# Altium footprint library PcbLib_ICs.PcbLib: 317 footprints (part 20 of 24)
Each footprint in its own frame and in the unit in brackets; x right, y up, seen from the top. Pads: shape width x height; smd on the part's side, far side on the other; paste and mask are expansions set on the pad; w line width, h text height; cw(c..) or ccw(c..) is an arc to the next point about the centre after c.
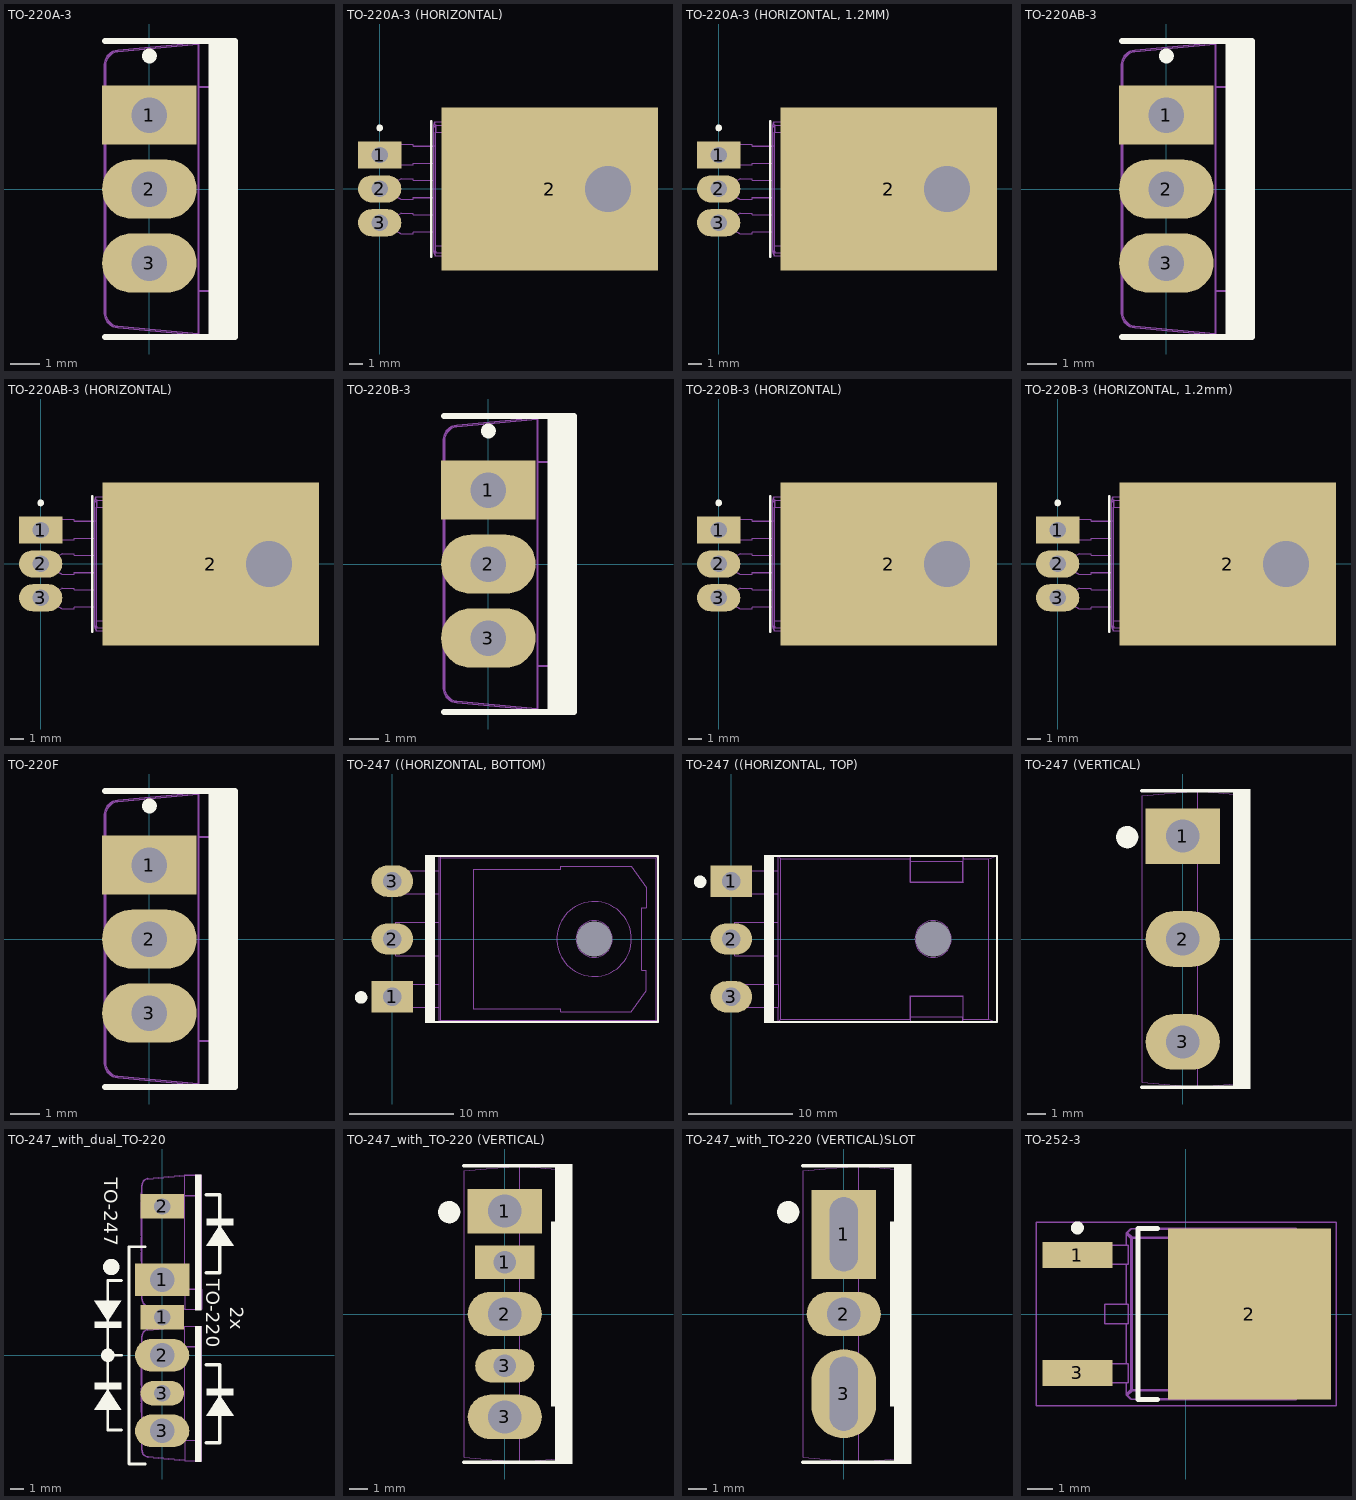
[diagram p19: the footprints below, top view; thin cyan lines are the x and y axes]

## TO-220A-3 [mm]
height 4.57
pads (3):
  rect 3.2x2 hole 1.2: 1(0,2.5)
  oval 3.2x2 hole 1.2: 2(0,0) 3(0,-2.5)
Top Overlay:
  circle w0.25: c0,4.5 r0.125
  rectangle: 2,-5 2.9,5
  lines w0.2: -1.5,-5 2.9,-5 2.9,5 -1.5,5
Top Assy:
  lines w0.05: -1.53,-2.69 -1.53,-2.737 -1.52,-2.737 ; -1.53,-0.067 -1.53,0.003 ; -1.53,0.026 -1.53,0.003 ; -1.53,0.459 -1.53,0.455 -1.52,0.455 ; -1.53,0.468 -1.52,0.468 ; -1.53,0.591 -1.53,0.686 ; -1.53,1.238 -1.53,1.343 ; -1.53,1.689 -1.53,1.783 ; -1.53,2.348 -1.53,2.442 ; -1.53,3.006 -1.53,3.02 -1.52,3.02 ; -1.52,-2.673 -1.53,-2.673 -1.53,-2.473 ; -1.52,-2.473 -1.53,-2.473 ; -1.52,-2.269 -1.53,-2.269 ; -1.52,-2.109 -1.53,-2.109 -1.53,-2.269 ; -1.52,-1.961 -1.53,-1.961 -1.53,-1.94 ; -1.52,-1.94 -1.53,-1.94 ; -1.52,-1.393 -1.53,-1.393 ; -1.52,-1.391 -1.53,-1.391 ; -1.52,-1.281 -1.53,-1.281 ; -1.52,-0.735 -1.53,-0.735 ; -1.52,-0.623 -1.53,-0.623 ; -1.52,-0.076 -1.53,-0.076 -1.53,-0.623 ; -1.52,0.003 -1.53,0.003 ; -1.52,0.035 -1.53,0.035 -1.53,0.363 -1.52,0.363 ; -1.52,0.473 -1.53,0.473 -1.53,0.583 -1.52,0.583 ; -1.52,0.694 -1.53,0.694 -1.53,1.241 -1.52,1.241 ; -1.52,1.352 -1.53,1.352 -1.53,1.68 -1.52,1.68 ; -1.52,1.792 -1.53,1.792 -1.53,1.901 ; -1.52,1.901 -1.53,1.901 ; -1.52,2.339 -1.53,2.339 -1.53,1.901 ; -1.52,2.45 -1.53,2.45 -1.53,2.997 -1.52,2.997 ; -1.52,3.109 -1.53,3.109 -1.53,3.656 -1.52,3.656 ; 1.657,-4.894 -1.064,-4.639 ; 1.657,4.902 -1.064,4.647 ; 1.674,-4.946 -1.067,-4.689 ; 1.674,4.953 -1.067,4.696 ; -1.53,-2.473 -1.53,-2.269 ; -1.53,-1.94 -1.53,-1.393 ; -1.53,-1.393 -1.53,-1.391 ; -1.53,-1.391 -1.53,-1.281 ; -1.53,-1.281 -1.53,-0.735 ; -1.53,-0.735 -1.53,-0.623 ; -1.52,-4.191 ccw(c-1.02,-4.191) -1.067,-4.689 ; -1.52,-4.191 -1.52,4.198 ; -1.52,-4.191 -1.472,-4.191 ; -1.52,4.198 cw(c-1.02,4.198) -1.067,4.696 ; -1.52,4.198 -1.472,4.198 ; -1.472,-4.191 ccw(c-1.022,-4.191) -1.064,-4.639 ; -1.472,-4.191 -1.472,4.198 ; -1.472,4.198 cw(c-1.022,4.198) -1.064,4.647 ; -1.067,-4.689 cw(c-0.688,-4.687) -1.064,-4.639 ; -1.067,4.696 ccw(c-0.688,4.694) -1.064,4.647 ; 1.657,-4.926 ccw(c1.677,-4.926) 1.677,-4.946 ; 1.657,-4.926 ccw(c1.676,-4.924) 1.677,-4.943 ; 1.657,-4.926 1.657,-3.436 ; 1.657,-3.436 ccw(c1.676,-3.434) 1.677,-3.452 ; 1.657,-3.436 1.657,3.443 ; 1.657,-3.436 1.677,-3.436 ; 1.657,3.443 cw(c1.676,3.441) 1.677,3.46 ; 1.657,3.443 1.657,4.934 ; 1.657,3.443 1.677,3.443 ; 1.657,4.934 cw(c1.677,4.934) 1.677,4.954 ; 1.657,4.934 cw(c1.676,4.932) 1.677,4.95 ; 1.677,-4.946 2.907,-4.946 ; 1.677,-4.946 1.677,-4.943 ; 1.677,-4.943 1.677,-3.452 ; 1.677,-4.943 2.907,-4.943 ; 1.677,-3.452 1.677,-3.436 ; 1.677,-3.452 2.907,-3.452 ; 1.677,-3.436 1.677,3.443 ; 1.677,-3.436 2.907,-3.436 ; 1.677,3.443 2.907,3.443 ; 1.677,3.443 1.677,3.46 ; 1.677,3.46 2.907,3.46 ; 1.677,3.46 1.677,4.95 ; 1.677,4.95 2.907,4.95 ; 1.677,4.95 1.677,4.954 ; 1.677,4.954 2.907,4.954 ; 2.907,-4.946 ccw(c2.907,-4.926) 2.927,-4.926 ; 2.907,-4.946 2.927,-4.946 2.927,-4.926 ; 2.907,-4.946 2.907,-4.943 ; 2.907,-4.943 ccw(c2.909,-4.924) 2.927,-4.926 ; 2.907,-4.943 2.907,-3.452 ; 2.907,-3.452 ccw(c2.909,-3.434) 2.927,-3.436 ; 2.907,-3.452 2.907,-3.436 ; 2.907,-3.436 2.907,3.443 ; 2.907,-3.436 2.927,-3.436 ; 2.907,3.443 2.907,3.46 ; 2.907,3.443 2.927,3.443 ; 2.907,3.46 cw(c2.909,3.441) 2.927,3.443 ; 2.907,3.46 2.907,4.95 ; 2.907,4.95 cw(c2.909,4.932) 2.927,4.934 ; 2.907,4.95 2.907,4.954 ; 2.907,4.954 cw(c2.907,4.934) 2.927,4.934 ; 2.907,4.954 2.927,4.954 2.927,4.934 ; 2.927,-4.926 2.927,-3.436 ; 2.927,-3.436 2.927,3.443 ; 2.927,3.443 2.927,4.934
  text ".Designator" at 0.7,-5.162 h3
3D body "User Library-TO220-A PCB.step": height 19.99, standoff -3.5, extent -1.55,-4.95 2.907,4.95

## TO-220A-3 (HORIZONTAL) [mm]
height 4.57
pads (5):
  rect 3.2x2 hole 1.2: 1(0,2.5)
  oval 3.2x2 hole 1.2: 2(0,0) 3(0,-2.5)
  rect 16x12 smd paste-10: 2(12.548,-0.01)
  round 0 hole 3.4 unplated: 6(16.868,-0.006)
Top Overlay:
  circle w0.25: c0,4.5 r0.125
  lines w0.2: 3.8,-5 3.8,5
Top Paste:
  rectangle: 13.948,-3.96 14.948,-2.96
  rectangle: 13.948,-2.81 14.948,-1.81
  rectangle: 13.948,-1.66 14.948,-0.66
  rectangle: 13.948,-0.51 14.948,0.49
  rectangle: 13.948,0.64 14.948,1.64
  rectangle: 13.948,1.79 14.948,2.79
  rectangle: 13.948,2.94 14.948,3.94
  rectangle: 13.948,4.09 14.948,5.09
  rectangle: 12.715,-3.96 13.715,-2.96
  rectangle: 12.715,-2.81 13.715,-1.81
  rectangle: 12.715,-1.66 13.715,-0.66
  rectangle: 12.715,-0.51 13.715,0.49
  rectangle: 12.715,0.64 13.715,1.64
  rectangle: 12.715,1.79 13.715,2.79
  rectangle: 12.715,2.94 13.715,3.94
  rectangle: 12.715,4.09 13.715,5.09
  rectangle: 11.482,-3.96 12.482,-2.96
  rectangle: 11.482,-2.81 12.482,-1.81
  rectangle: 11.482,-1.66 12.482,-0.66
  rectangle: 11.482,-0.51 12.482,0.49
  rectangle: 11.482,0.64 12.482,1.64
  rectangle: 11.482,1.79 12.482,2.79
  rectangle: 11.482,2.94 12.482,3.94
  rectangle: 11.482,4.09 12.482,5.09
  rectangle: 10.248,-3.96 11.248,-2.96
  rectangle: 10.248,-2.81 11.248,-1.81
  rectangle: 10.248,-1.66 11.248,-0.66
  rectangle: 10.248,-0.51 11.248,0.49
  rectangle: 10.248,0.64 11.248,1.64
  rectangle: 10.248,1.79 11.248,2.79
  rectangle: 10.248,2.94 11.248,3.94
  rectangle: 10.248,4.09 11.248,5.09
  rectangle: 9.015,-3.96 10.015,-2.96
  rectangle: 9.015,-2.81 10.015,-1.81
  rectangle: 9.015,-1.66 10.015,-0.66
  rectangle: 9.015,-0.51 10.015,0.49
  rectangle: 9.015,0.64 10.015,1.64
  rectangle: 9.015,1.79 10.015,2.79
  rectangle: 9.015,2.94 10.015,3.94
  rectangle: 9.015,4.09 10.015,5.09
  rectangle: 7.782,-3.96 8.782,-2.96
  rectangle: 7.782,-2.81 8.782,-1.81
  rectangle: 7.782,-1.66 8.782,-0.66
  rectangle: 7.782,-0.51 8.782,0.49
  rectangle: 7.782,0.64 8.782,1.64
  rectangle: 7.782,1.79 8.782,2.79
  rectangle: 7.782,2.94 8.782,3.94
  rectangle: 7.782,4.09 8.782,5.09
  rectangle: 6.548,4.09 7.548,5.09
  rectangle: 6.548,2.94 7.548,3.94
  rectangle: 6.548,1.79 7.548,2.79
  rectangle: 6.548,0.64 7.548,1.64
  rectangle: 6.548,-0.51 7.548,0.49
  rectangle: 6.548,-1.66 7.548,-0.66
  rectangle: 6.548,-2.81 7.548,-1.81
  rectangle: 6.548,-3.96 7.548,-2.96
  rectangle: 13.948,-5.11 14.948,-4.11
  rectangle: 12.715,-5.11 13.715,-4.11
  rectangle: 11.482,-5.11 12.482,-4.11
  rectangle: 10.248,-5.11 11.248,-4.11
  rectangle: 9.015,-5.11 10.015,-4.11
  rectangle: 7.782,-5.11 8.782,-4.11
  rectangle: 6.548,-5.11 7.548,-4.11
Top Assy:
  drawing of 1101 lines, arcs and shapes, not listed
  text ".Designator" at 5.325,-0.77 h3
3D body "User Library-TO220-A-H PCB.step": height 4.55, standoff -3.58, extent -0.3,-4.95 19.913,4.95

## TO-220A-3 (HORIZONTAL, 1.2MM) [mm]
height 4.57
pads (5):
  rect 3.2x2 hole 1.2: 1(0,2.5)
  oval 3.2x2 hole 1.2: 2(0,0) 3(0,-2.5)
  rect 16x12 smd paste-10: 2(12.548,-0.01)
  round 0 hole 3.4 unplated: 6(16.868,-0.006)
Top Overlay:
  circle w0.25: c0,4.5 r0.125
  lines w0.2: 3.8,-5 3.8,5
Top Paste:
  rectangle: 6.548,-5.11 7.548,-4.11
  rectangle: 7.782,-5.11 8.782,-4.11
  rectangle: 9.015,-5.11 10.015,-4.11
  rectangle: 10.248,-5.11 11.248,-4.11
  rectangle: 11.482,-5.11 12.482,-4.11
  rectangle: 12.715,-5.11 13.715,-4.11
  rectangle: 13.948,-5.11 14.948,-4.11
  rectangle: 6.548,-3.96 7.548,-2.96
  rectangle: 6.548,-2.81 7.548,-1.81
  rectangle: 6.548,-1.66 7.548,-0.66
  rectangle: 6.548,-0.51 7.548,0.49
  rectangle: 6.548,0.64 7.548,1.64
  rectangle: 6.548,1.79 7.548,2.79
  rectangle: 6.548,2.94 7.548,3.94
  rectangle: 6.548,4.09 7.548,5.09
  rectangle: 7.782,4.09 8.782,5.09
  rectangle: 7.782,2.94 8.782,3.94
  rectangle: 7.782,1.79 8.782,2.79
  rectangle: 7.782,0.64 8.782,1.64
  rectangle: 7.782,-0.51 8.782,0.49
  rectangle: 7.782,-1.66 8.782,-0.66
  rectangle: 7.782,-2.81 8.782,-1.81
  rectangle: 7.782,-3.96 8.782,-2.96
  rectangle: 9.015,4.09 10.015,5.09
  rectangle: 9.015,2.94 10.015,3.94
  rectangle: 9.015,1.79 10.015,2.79
  rectangle: 9.015,0.64 10.015,1.64
  rectangle: 9.015,-0.51 10.015,0.49
  rectangle: 9.015,-1.66 10.015,-0.66
  rectangle: 9.015,-2.81 10.015,-1.81
  rectangle: 9.015,-3.96 10.015,-2.96
  rectangle: 10.248,4.09 11.248,5.09
  rectangle: 10.248,2.94 11.248,3.94
  rectangle: 10.248,1.79 11.248,2.79
  rectangle: 10.248,0.64 11.248,1.64
  rectangle: 10.248,-0.51 11.248,0.49
  rectangle: 10.248,-1.66 11.248,-0.66
  rectangle: 10.248,-2.81 11.248,-1.81
  rectangle: 10.248,-3.96 11.248,-2.96
  rectangle: 11.482,4.09 12.482,5.09
  rectangle: 11.482,2.94 12.482,3.94
  rectangle: 11.482,1.79 12.482,2.79
  rectangle: 11.482,0.64 12.482,1.64
  rectangle: 11.482,-0.51 12.482,0.49
  rectangle: 11.482,-1.66 12.482,-0.66
  rectangle: 11.482,-2.81 12.482,-1.81
  rectangle: 11.482,-3.96 12.482,-2.96
  rectangle: 12.715,4.09 13.715,5.09
  rectangle: 12.715,2.94 13.715,3.94
  rectangle: 12.715,1.79 13.715,2.79
  rectangle: 12.715,0.64 13.715,1.64
  rectangle: 12.715,-0.51 13.715,0.49
  rectangle: 12.715,-1.66 13.715,-0.66
  rectangle: 12.715,-2.81 13.715,-1.81
  rectangle: 12.715,-3.96 13.715,-2.96
  rectangle: 13.948,4.09 14.948,5.09
  rectangle: 13.948,2.94 14.948,3.94
  rectangle: 13.948,1.79 14.948,2.79
  rectangle: 13.948,0.64 14.948,1.64
  rectangle: 13.948,-0.51 14.948,0.49
  rectangle: 13.948,-1.66 14.948,-0.66
  rectangle: 13.948,-2.81 14.948,-1.81
  rectangle: 13.948,-3.96 14.948,-2.96
Top Assy:
  drawing of 1101 lines, arcs and shapes, not listed
  text ".Designator" at 5.325,-0.77 h3
3D body "User Library-TO220-A-H PCB.step": height 5.85, standoff -2.28, extent -0.3,-4.95 19.913,4.95

## TO-220AB-3 [mm]
height 4.57
pads (3):
  rect 3.2x2 hole 1.2: 1(0,2.5)
  oval 3.2x2 hole 1.2: 2(0,0) 3(0,-2.5)
Top Overlay:
  circle w0.25: c0,4.5 r0.125
  rectangle: 2,-5 2.9,5
  lines w0.2: -1.5,-5 2.9,-5 2.9,5 -1.5,5
Top Assy:
  lines w0.05: -1.53,-2.69 -1.53,-2.737 -1.52,-2.737 ; -1.53,-0.067 -1.53,0.003 ; -1.53,0.026 -1.53,0.003 ; -1.53,0.459 -1.53,0.455 -1.52,0.455 ; -1.53,0.468 -1.52,0.468 ; -1.53,0.591 -1.53,0.686 ; -1.53,1.238 -1.53,1.343 ; -1.53,1.689 -1.53,1.783 ; -1.53,2.348 -1.53,2.442 ; -1.53,3.006 -1.53,3.02 -1.52,3.02 ; -1.52,-2.673 -1.53,-2.673 -1.53,-2.473 ; -1.52,-2.473 -1.53,-2.473 ; -1.52,-2.269 -1.53,-2.269 ; -1.52,-2.109 -1.53,-2.109 -1.53,-2.269 ; -1.52,-1.961 -1.53,-1.961 -1.53,-1.94 ; -1.52,-1.94 -1.53,-1.94 ; -1.52,-1.393 -1.53,-1.393 ; -1.52,-1.391 -1.53,-1.391 ; -1.52,-1.281 -1.53,-1.281 ; -1.52,-0.735 -1.53,-0.735 ; -1.52,-0.623 -1.53,-0.623 ; -1.52,-0.076 -1.53,-0.076 -1.53,-0.623 ; -1.52,0.003 -1.53,0.003 ; -1.52,0.035 -1.53,0.035 -1.53,0.363 -1.52,0.363 ; -1.52,0.473 -1.53,0.473 -1.53,0.583 -1.52,0.583 ; -1.52,0.694 -1.53,0.694 -1.53,1.241 -1.52,1.241 ; -1.52,1.352 -1.53,1.352 -1.53,1.68 -1.52,1.68 ; -1.52,1.792 -1.53,1.792 -1.53,1.901 ; -1.52,1.901 -1.53,1.901 ; -1.52,2.339 -1.53,2.339 -1.53,1.901 ; -1.52,2.45 -1.53,2.45 -1.53,2.997 -1.52,2.997 ; -1.52,3.109 -1.53,3.109 -1.53,3.656 -1.52,3.656 ; 1.657,-4.894 -1.064,-4.639 ; 1.657,4.902 -1.064,4.647 ; 1.674,-4.946 -1.067,-4.689 ; 1.674,4.953 -1.067,4.696 ; -1.53,-2.473 -1.53,-2.269 ; -1.53,-1.94 -1.53,-1.393 ; -1.53,-1.393 -1.53,-1.391 ; -1.53,-1.391 -1.53,-1.281 ; -1.53,-1.281 -1.53,-0.735 ; -1.53,-0.735 -1.53,-0.623 ; -1.52,-4.191 ccw(c-1.02,-4.191) -1.067,-4.689 ; -1.52,-4.191 -1.52,4.198 ; -1.52,-4.191 -1.472,-4.191 ; -1.52,4.198 cw(c-1.02,4.198) -1.067,4.696 ; -1.52,4.198 -1.472,4.198 ; -1.472,-4.191 ccw(c-1.022,-4.191) -1.064,-4.639 ; -1.472,-4.191 -1.472,4.198 ; -1.472,4.198 cw(c-1.022,4.198) -1.064,4.647 ; -1.067,-4.689 cw(c-0.688,-4.687) -1.064,-4.639 ; -1.067,4.696 ccw(c-0.688,4.694) -1.064,4.647 ; 1.657,-4.926 ccw(c1.677,-4.926) 1.677,-4.946 ; 1.657,-4.926 ccw(c1.676,-4.924) 1.677,-4.943 ; 1.657,-4.926 1.657,-3.436 ; 1.657,-3.436 ccw(c1.676,-3.434) 1.677,-3.452 ; 1.657,-3.436 1.657,3.443 ; 1.657,-3.436 1.677,-3.436 ; 1.657,3.443 cw(c1.676,3.441) 1.677,3.46 ; 1.657,3.443 1.657,4.934 ; 1.657,3.443 1.677,3.443 ; 1.657,4.934 cw(c1.677,4.934) 1.677,4.954 ; 1.657,4.934 cw(c1.676,4.932) 1.677,4.95 ; 1.677,-4.946 2.907,-4.946 ; 1.677,-4.946 1.677,-4.943 ; 1.677,-4.943 1.677,-3.452 ; 1.677,-4.943 2.907,-4.943 ; 1.677,-3.452 1.677,-3.436 ; 1.677,-3.452 2.907,-3.452 ; 1.677,-3.436 1.677,3.443 ; 1.677,-3.436 2.907,-3.436 ; 1.677,3.443 2.907,3.443 ; 1.677,3.443 1.677,3.46 ; 1.677,3.46 2.907,3.46 ; 1.677,3.46 1.677,4.95 ; 1.677,4.95 2.907,4.95 ; 1.677,4.95 1.677,4.954 ; 1.677,4.954 2.907,4.954 ; 2.907,-4.946 ccw(c2.907,-4.926) 2.927,-4.926 ; 2.907,-4.946 2.927,-4.946 2.927,-4.926 ; 2.907,-4.946 2.907,-4.943 ; 2.907,-4.943 ccw(c2.909,-4.924) 2.927,-4.926 ; 2.907,-4.943 2.907,-3.452 ; 2.907,-3.452 ccw(c2.909,-3.434) 2.927,-3.436 ; 2.907,-3.452 2.907,-3.436 ; 2.907,-3.436 2.907,3.443 ; 2.907,-3.436 2.927,-3.436 ; 2.907,3.443 2.907,3.46 ; 2.907,3.443 2.927,3.443 ; 2.907,3.46 cw(c2.909,3.441) 2.927,3.443 ; 2.907,3.46 2.907,4.95 ; 2.907,4.95 cw(c2.909,4.932) 2.927,4.934 ; 2.907,4.95 2.907,4.954 ; 2.907,4.954 cw(c2.907,4.934) 2.927,4.934 ; 2.907,4.954 2.927,4.954 2.927,4.934 ; 2.927,-4.926 2.927,-3.436 ; 2.927,-3.436 2.927,3.443 ; 2.927,3.443 2.927,4.934
  text ".Designator" at 0.7,-5.162 h3
3D body "User Library-TO220-AB PCB.step": height 20.05, standoff -3.5, extent -1.55,-4.95 2.907,4.95

## TO-220AB-3 (HORIZONTAL) [mm]
height 4.57
pads (5):
  rect 3.2x2 hole 1.2: 1(0,2.5)
  oval 3.2x2 hole 1.2: 2(0,0) 3(0,-2.5)
  rect 16x12 smd paste-10: 2(12.548,-0.01)
  round 0 hole 3.4 unplated: 6(16.868,-0.006)
Top Overlay:
  circle w0.25: c0,4.5 r0.125
  lines w0.2: 3.8,-5 3.8,5
Top Paste:
  rectangle: 13.948,-3.96 14.948,-2.96
  rectangle: 13.948,-2.81 14.948,-1.81
  rectangle: 13.948,-1.66 14.948,-0.66
  rectangle: 13.948,-0.51 14.948,0.49
  rectangle: 13.948,0.64 14.948,1.64
  rectangle: 13.948,1.79 14.948,2.79
  rectangle: 13.948,2.94 14.948,3.94
  rectangle: 13.948,4.09 14.948,5.09
  rectangle: 12.715,-3.96 13.715,-2.96
  rectangle: 12.715,-2.81 13.715,-1.81
  rectangle: 12.715,-1.66 13.715,-0.66
  rectangle: 12.715,-0.51 13.715,0.49
  rectangle: 12.715,0.64 13.715,1.64
  rectangle: 12.715,1.79 13.715,2.79
  rectangle: 12.715,2.94 13.715,3.94
  rectangle: 12.715,4.09 13.715,5.09
  rectangle: 11.482,-3.96 12.482,-2.96
  rectangle: 11.482,-2.81 12.482,-1.81
  rectangle: 11.482,-1.66 12.482,-0.66
  rectangle: 11.482,-0.51 12.482,0.49
  rectangle: 11.482,0.64 12.482,1.64
  rectangle: 11.482,1.79 12.482,2.79
  rectangle: 11.482,2.94 12.482,3.94
  rectangle: 11.482,4.09 12.482,5.09
  rectangle: 10.248,-3.96 11.248,-2.96
  rectangle: 10.248,-2.81 11.248,-1.81
  rectangle: 10.248,-1.66 11.248,-0.66
  rectangle: 10.248,-0.51 11.248,0.49
  rectangle: 10.248,0.64 11.248,1.64
  rectangle: 10.248,1.79 11.248,2.79
  rectangle: 10.248,2.94 11.248,3.94
  rectangle: 10.248,4.09 11.248,5.09
  rectangle: 9.015,-3.96 10.015,-2.96
  rectangle: 9.015,-2.81 10.015,-1.81
  rectangle: 9.015,-1.66 10.015,-0.66
  rectangle: 9.015,-0.51 10.015,0.49
  rectangle: 9.015,0.64 10.015,1.64
  rectangle: 9.015,1.79 10.015,2.79
  rectangle: 9.015,2.94 10.015,3.94
  rectangle: 9.015,4.09 10.015,5.09
  rectangle: 7.782,-3.96 8.782,-2.96
  rectangle: 7.782,-2.81 8.782,-1.81
  rectangle: 7.782,-1.66 8.782,-0.66
  rectangle: 7.782,-0.51 8.782,0.49
  rectangle: 7.782,0.64 8.782,1.64
  rectangle: 7.782,1.79 8.782,2.79
  rectangle: 7.782,2.94 8.782,3.94
  rectangle: 7.782,4.09 8.782,5.09
  rectangle: 6.548,4.09 7.548,5.09
  rectangle: 6.548,2.94 7.548,3.94
  rectangle: 6.548,1.79 7.548,2.79
  rectangle: 6.548,0.64 7.548,1.64
  rectangle: 6.548,-0.51 7.548,0.49
  rectangle: 6.548,-1.66 7.548,-0.66
  rectangle: 6.548,-2.81 7.548,-1.81
  rectangle: 6.548,-3.96 7.548,-2.96
  rectangle: 13.948,-5.11 14.948,-4.11
  rectangle: 12.715,-5.11 13.715,-4.11
  rectangle: 11.482,-5.11 12.482,-4.11
  rectangle: 10.248,-5.11 11.248,-4.11
  rectangle: 9.015,-5.11 10.015,-4.11
  rectangle: 7.782,-5.11 8.782,-4.11
  rectangle: 6.548,-5.11 7.548,-4.11
Top Assy:
  drawing of 1105 lines, arcs and shapes, not listed
  text ".Designator" at 5.325,-0.77 h3
3D body "User Library-TO220-AB-H PCB.step": height 4.55, standoff -3.58, extent -0.3,-4.95 19.912,4.95

## TO-220B-3 [mm]
height 4.57
pads (3):
  rect 3.2x2 hole 1.2: 1(0,2.5)
  oval 3.2x2 hole 1.2: 2(0,0) 3(0,-2.5)
Top Overlay:
  circle w0.25: c0,4.5 r0.125
  rectangle: 2,-5 2.9,5
  lines w0.2: -1.5,-5 2.9,-5 2.9,5 -1.5,5
Top Assy:
  lines w0.05: -1.53,-2.69 -1.53,-2.737 -1.52,-2.737 ; -1.53,-0.067 -1.53,0.003 ; -1.53,0.026 -1.53,0.003 ; -1.53,0.459 -1.53,0.455 -1.52,0.455 ; -1.53,0.468 -1.52,0.468 ; -1.53,0.591 -1.53,0.686 ; -1.53,1.238 -1.53,1.343 ; -1.53,1.689 -1.53,1.783 ; -1.53,2.348 -1.53,2.442 ; -1.53,3.006 -1.53,3.02 -1.52,3.02 ; -1.52,-2.673 -1.53,-2.673 -1.53,-2.473 ; -1.52,-2.473 -1.53,-2.473 ; -1.52,-2.269 -1.53,-2.269 ; -1.52,-2.109 -1.53,-2.109 -1.53,-2.269 ; -1.52,-1.961 -1.53,-1.961 -1.53,-1.94 ; -1.52,-1.94 -1.53,-1.94 ; -1.52,-1.393 -1.53,-1.393 ; -1.52,-1.391 -1.53,-1.391 ; -1.52,-1.281 -1.53,-1.281 ; -1.52,-0.735 -1.53,-0.735 ; -1.52,-0.623 -1.53,-0.623 ; -1.52,-0.076 -1.53,-0.076 -1.53,-0.623 ; -1.52,0.003 -1.53,0.003 ; -1.52,0.035 -1.53,0.035 -1.53,0.363 -1.52,0.363 ; -1.52,0.473 -1.53,0.473 -1.53,0.583 -1.52,0.583 ; -1.52,0.694 -1.53,0.694 -1.53,1.241 -1.52,1.241 ; -1.52,1.352 -1.53,1.352 -1.53,1.68 -1.52,1.68 ; -1.52,1.792 -1.53,1.792 -1.53,1.901 ; -1.52,1.901 -1.53,1.901 ; -1.52,2.339 -1.53,2.339 -1.53,1.901 ; -1.52,2.45 -1.53,2.45 -1.53,2.997 -1.52,2.997 ; -1.52,3.109 -1.53,3.109 -1.53,3.656 -1.52,3.656 ; 1.657,-4.894 -1.064,-4.639 ; 1.657,4.902 -1.064,4.647 ; 1.674,-4.946 -1.067,-4.689 ; 1.674,4.953 -1.067,4.696 ; -1.53,-2.473 -1.53,-2.269 ; -1.53,-1.94 -1.53,-1.393 ; -1.53,-1.393 -1.53,-1.391 ; -1.53,-1.391 -1.53,-1.281 ; -1.53,-1.281 -1.53,-0.735 ; -1.53,-0.735 -1.53,-0.623 ; -1.52,-4.191 ccw(c-1.02,-4.191) -1.067,-4.689 ; -1.52,-4.191 -1.52,4.198 ; -1.52,-4.191 -1.472,-4.191 ; -1.52,4.198 cw(c-1.02,4.198) -1.067,4.696 ; -1.52,4.198 -1.472,4.198 ; -1.472,-4.191 ccw(c-1.022,-4.191) -1.064,-4.639 ; -1.472,-4.191 -1.472,4.198 ; -1.472,4.198 cw(c-1.022,4.198) -1.064,4.647 ; -1.067,-4.689 cw(c-0.688,-4.687) -1.064,-4.639 ; -1.067,4.696 ccw(c-0.688,4.694) -1.064,4.647 ; 1.657,-4.926 ccw(c1.677,-4.926) 1.677,-4.946 ; 1.657,-4.926 ccw(c1.676,-4.924) 1.677,-4.943 ; 1.657,-4.926 1.657,-3.436 ; 1.657,-3.436 ccw(c1.676,-3.434) 1.677,-3.452 ; 1.657,-3.436 1.657,3.443 ; 1.657,-3.436 1.677,-3.436 ; 1.657,3.443 cw(c1.676,3.441) 1.677,3.46 ; 1.657,3.443 1.657,4.934 ; 1.657,3.443 1.677,3.443 ; 1.657,4.934 cw(c1.677,4.934) 1.677,4.954 ; 1.657,4.934 cw(c1.676,4.932) 1.677,4.95 ; 1.677,-4.946 2.907,-4.946 ; 1.677,-4.946 1.677,-4.943 ; 1.677,-4.943 1.677,-3.452 ; 1.677,-4.943 2.907,-4.943 ; 1.677,-3.452 1.677,-3.436 ; 1.677,-3.452 2.907,-3.452 ; 1.677,-3.436 1.677,3.443 ; 1.677,-3.436 2.907,-3.436 ; 1.677,3.443 2.907,3.443 ; 1.677,3.443 1.677,3.46 ; 1.677,3.46 2.907,3.46 ; 1.677,3.46 1.677,4.95 ; 1.677,4.95 2.907,4.95 ; 1.677,4.95 1.677,4.954 ; 1.677,4.954 2.907,4.954 ; 2.907,-4.946 ccw(c2.907,-4.926) 2.927,-4.926 ; 2.907,-4.946 2.927,-4.946 2.927,-4.926 ; 2.907,-4.946 2.907,-4.943 ; 2.907,-4.943 ccw(c2.909,-4.924) 2.927,-4.926 ; 2.907,-4.943 2.907,-3.452 ; 2.907,-3.452 ccw(c2.909,-3.434) 2.927,-3.436 ; 2.907,-3.452 2.907,-3.436 ; 2.907,-3.436 2.907,3.443 ; 2.907,-3.436 2.927,-3.436 ; 2.907,3.443 2.907,3.46 ; 2.907,3.443 2.927,3.443 ; 2.907,3.46 cw(c2.909,3.441) 2.927,3.443 ; 2.907,3.46 2.907,4.95 ; 2.907,4.95 cw(c2.909,4.932) 2.927,4.934 ; 2.907,4.95 2.907,4.954 ; 2.907,4.954 cw(c2.907,4.934) 2.927,4.934 ; 2.907,4.954 2.927,4.954 2.927,4.934 ; 2.927,-4.926 2.927,-3.436 ; 2.927,-3.436 2.927,3.443 ; 2.927,3.443 2.927,4.934
  text ".Designator" at 0.7,-5.162 h3
3D body "User Library-TO220-B PCB.step": height 20.05, standoff -3.5, extent -1.55,-4.95 2.907,4.95

## TO-220B-3 (HORIZONTAL) [mm]
height 4.57
pads (5):
  rect 3.2x2 hole 1.2: 1(0,2.5)
  oval 3.2x2 hole 1.2: 2(0,0) 3(0,-2.5)
  rect 16x12 smd paste-10: 2(12.548,-0.01)
  round 0 hole 3.4 unplated: 6(16.868,-0.006)
Top Overlay:
  circle w0.25: c0,4.5 r0.125
  lines w0.2: 3.8,-5 3.8,5
Top Paste:
  rectangle: 6.548,-5.11 7.548,-4.11
  rectangle: 7.782,-5.11 8.782,-4.11
  rectangle: 9.015,-5.11 10.015,-4.11
  rectangle: 10.248,-5.11 11.248,-4.11
  rectangle: 11.482,-5.11 12.482,-4.11
  rectangle: 12.715,-5.11 13.715,-4.11
  rectangle: 13.948,-5.11 14.948,-4.11
  rectangle: 6.548,-3.96 7.548,-2.96
  rectangle: 6.548,-2.81 7.548,-1.81
  rectangle: 6.548,-1.66 7.548,-0.66
  rectangle: 6.548,-0.51 7.548,0.49
  rectangle: 6.548,0.64 7.548,1.64
  rectangle: 6.548,1.79 7.548,2.79
  rectangle: 6.548,2.94 7.548,3.94
  rectangle: 6.548,4.09 7.548,5.09
  rectangle: 7.782,4.09 8.782,5.09
  rectangle: 7.782,2.94 8.782,3.94
  rectangle: 7.782,1.79 8.782,2.79
  rectangle: 7.782,0.64 8.782,1.64
  rectangle: 7.782,-0.51 8.782,0.49
  rectangle: 7.782,-1.66 8.782,-0.66
  rectangle: 7.782,-2.81 8.782,-1.81
  rectangle: 7.782,-3.96 8.782,-2.96
  rectangle: 9.015,4.09 10.015,5.09
  rectangle: 9.015,2.94 10.015,3.94
  rectangle: 9.015,1.79 10.015,2.79
  rectangle: 9.015,0.64 10.015,1.64
  rectangle: 9.015,-0.51 10.015,0.49
  rectangle: 9.015,-1.66 10.015,-0.66
  rectangle: 9.015,-2.81 10.015,-1.81
  rectangle: 9.015,-3.96 10.015,-2.96
  rectangle: 10.248,4.09 11.248,5.09
  rectangle: 10.248,2.94 11.248,3.94
  rectangle: 10.248,1.79 11.248,2.79
  rectangle: 10.248,0.64 11.248,1.64
  rectangle: 10.248,-0.51 11.248,0.49
  rectangle: 10.248,-1.66 11.248,-0.66
  rectangle: 10.248,-2.81 11.248,-1.81
  rectangle: 10.248,-3.96 11.248,-2.96
  rectangle: 11.482,4.09 12.482,5.09
  rectangle: 11.482,2.94 12.482,3.94
  rectangle: 11.482,1.79 12.482,2.79
  rectangle: 11.482,0.64 12.482,1.64
  rectangle: 11.482,-0.51 12.482,0.49
  rectangle: 11.482,-1.66 12.482,-0.66
  rectangle: 11.482,-2.81 12.482,-1.81
  rectangle: 11.482,-3.96 12.482,-2.96
  rectangle: 12.715,4.09 13.715,5.09
  rectangle: 12.715,2.94 13.715,3.94
  rectangle: 12.715,1.79 13.715,2.79
  rectangle: 12.715,0.64 13.715,1.64
  rectangle: 12.715,-0.51 13.715,0.49
  rectangle: 12.715,-1.66 13.715,-0.66
  rectangle: 12.715,-2.81 13.715,-1.81
  rectangle: 12.715,-3.96 13.715,-2.96
  rectangle: 13.948,4.09 14.948,5.09
  rectangle: 13.948,2.94 14.948,3.94
  rectangle: 13.948,1.79 14.948,2.79
  rectangle: 13.948,0.64 14.948,1.64
  rectangle: 13.948,-0.51 14.948,0.49
  rectangle: 13.948,-1.66 14.948,-0.66
  rectangle: 13.948,-2.81 14.948,-1.81
  rectangle: 13.948,-3.96 14.948,-2.96
Top Assy:
  drawing of 1096 lines, arcs and shapes, not listed
  text ".Designator" at 5.325,-0.77 h3
3D body "User Library-TO220-B-H PCB.step": height 4.55, standoff -3.58, extent -0.3,-4.95 19.912,4.95

## TO-220B-3 (HORIZONTAL, 1.2mm) [mm]
height 4.57
pads (5):
  rect 3.2x2 hole 1.2: 1(0,2.5)
  oval 3.2x2 hole 1.2: 2(0,0) 3(0,-2.5)
  rect 16x12 smd paste-10: 2(12.548,-0.01)
  round 0 hole 3.4 unplated: 6(16.868,-0.006)
Top Overlay:
  circle w0.25: c0,4.5 r0.125
  lines w0.2: 3.8,-5 3.8,5
Top Paste:
  rectangle: 6.548,-5.11 7.548,-4.11
  rectangle: 7.782,-5.11 8.782,-4.11
  rectangle: 9.015,-5.11 10.015,-4.11
  rectangle: 10.248,-5.11 11.248,-4.11
  rectangle: 11.482,-5.11 12.482,-4.11
  rectangle: 12.715,-5.11 13.715,-4.11
  rectangle: 13.948,-5.11 14.948,-4.11
  rectangle: 6.548,-3.96 7.548,-2.96
  rectangle: 6.548,-2.81 7.548,-1.81
  rectangle: 6.548,-1.66 7.548,-0.66
  rectangle: 6.548,-0.51 7.548,0.49
  rectangle: 6.548,0.64 7.548,1.64
  rectangle: 6.548,1.79 7.548,2.79
  rectangle: 6.548,2.94 7.548,3.94
  rectangle: 6.548,4.09 7.548,5.09
  rectangle: 7.782,4.09 8.782,5.09
  rectangle: 7.782,2.94 8.782,3.94
  rectangle: 7.782,1.79 8.782,2.79
  rectangle: 7.782,0.64 8.782,1.64
  rectangle: 7.782,-0.51 8.782,0.49
  rectangle: 7.782,-1.66 8.782,-0.66
  rectangle: 7.782,-2.81 8.782,-1.81
  rectangle: 7.782,-3.96 8.782,-2.96
  rectangle: 9.015,4.09 10.015,5.09
  rectangle: 9.015,2.94 10.015,3.94
  rectangle: 9.015,1.79 10.015,2.79
  rectangle: 9.015,0.64 10.015,1.64
  rectangle: 9.015,-0.51 10.015,0.49
  rectangle: 9.015,-1.66 10.015,-0.66
  rectangle: 9.015,-2.81 10.015,-1.81
  rectangle: 9.015,-3.96 10.015,-2.96
  rectangle: 10.248,4.09 11.248,5.09
  rectangle: 10.248,2.94 11.248,3.94
  rectangle: 10.248,1.79 11.248,2.79
  rectangle: 10.248,0.64 11.248,1.64
  rectangle: 10.248,-0.51 11.248,0.49
  rectangle: 10.248,-1.66 11.248,-0.66
  rectangle: 10.248,-2.81 11.248,-1.81
  rectangle: 10.248,-3.96 11.248,-2.96
  rectangle: 11.482,4.09 12.482,5.09
  rectangle: 11.482,2.94 12.482,3.94
  rectangle: 11.482,1.79 12.482,2.79
  rectangle: 11.482,0.64 12.482,1.64
  rectangle: 11.482,-0.51 12.482,0.49
  rectangle: 11.482,-1.66 12.482,-0.66
  rectangle: 11.482,-2.81 12.482,-1.81
  rectangle: 11.482,-3.96 12.482,-2.96
  rectangle: 12.715,4.09 13.715,5.09
  rectangle: 12.715,2.94 13.715,3.94
  rectangle: 12.715,1.79 13.715,2.79
  rectangle: 12.715,0.64 13.715,1.64
  rectangle: 12.715,-0.51 13.715,0.49
  rectangle: 12.715,-1.66 13.715,-0.66
  rectangle: 12.715,-2.81 13.715,-1.81
  rectangle: 12.715,-3.96 13.715,-2.96
  rectangle: 13.948,4.09 14.948,5.09
  rectangle: 13.948,2.94 14.948,3.94
  rectangle: 13.948,1.79 14.948,2.79
  rectangle: 13.948,0.64 14.948,1.64
  rectangle: 13.948,-0.51 14.948,0.49
  rectangle: 13.948,-1.66 14.948,-0.66
  rectangle: 13.948,-2.81 14.948,-1.81
  rectangle: 13.948,-3.96 14.948,-2.96
Top Assy:
  drawing of 1096 lines, arcs and shapes, not listed
  text ".Designator" at 5.325,-0.77 h3
3D body "User Library-TO220-B-H PCB.step": height 5.85, standoff -2.28, extent -0.3,-4.95 19.913,4.95

## TO-220F [mm]
height 4.57
pads (3):
  rect 3.2x2 hole 1.2: 1(0,2.5)
  oval 3.2x2 hole 1.2: 2(0,0) 3(0,-2.5)
Top Overlay:
  circle w0.25: c0,4.5 r0.125
  rectangle: 2,-5 2.9,5
  lines w0.2: -1.5,-5 2.9,-5 2.9,5 -1.5,5
Top Assy:
  lines w0.05: -1.53,-2.69 -1.53,-2.737 -1.52,-2.737 ; -1.53,-0.067 -1.53,0.003 ; -1.53,0.026 -1.53,0.003 ; -1.53,0.459 -1.53,0.455 -1.52,0.455 ; -1.53,0.468 -1.52,0.468 ; -1.53,0.591 -1.53,0.686 ; -1.53,1.238 -1.53,1.343 ; -1.53,1.689 -1.53,1.783 ; -1.53,2.348 -1.53,2.442 ; -1.53,3.006 -1.53,3.02 -1.52,3.02 ; -1.52,-2.673 -1.53,-2.673 -1.53,-2.473 ; -1.52,-2.473 -1.53,-2.473 ; -1.52,-2.269 -1.53,-2.269 ; -1.52,-2.109 -1.53,-2.109 -1.53,-2.269 ; -1.52,-1.961 -1.53,-1.961 -1.53,-1.94 ; -1.52,-1.94 -1.53,-1.94 ; -1.52,-1.393 -1.53,-1.393 ; -1.52,-1.391 -1.53,-1.391 ; -1.52,-1.281 -1.53,-1.281 ; -1.52,-0.735 -1.53,-0.735 ; -1.52,-0.623 -1.53,-0.623 ; -1.52,-0.076 -1.53,-0.076 -1.53,-0.623 ; -1.52,0.003 -1.53,0.003 ; -1.52,0.035 -1.53,0.035 -1.53,0.363 -1.52,0.363 ; -1.52,0.473 -1.53,0.473 -1.53,0.583 -1.52,0.583 ; -1.52,0.694 -1.53,0.694 -1.53,1.241 -1.52,1.241 ; -1.52,1.352 -1.53,1.352 -1.53,1.68 -1.52,1.68 ; -1.52,1.792 -1.53,1.792 -1.53,1.901 ; -1.52,1.901 -1.53,1.901 ; -1.52,2.339 -1.53,2.339 -1.53,1.901 ; -1.52,2.45 -1.53,2.45 -1.53,2.997 -1.52,2.997 ; -1.52,3.109 -1.53,3.109 -1.53,3.656 -1.52,3.656 ; 1.657,-4.894 -1.064,-4.639 ; 1.657,4.902 -1.064,4.647 ; 1.674,-4.946 -1.067,-4.689 ; 1.674,4.953 -1.067,4.696 ; -1.53,-2.473 -1.53,-2.269 ; -1.53,-1.94 -1.53,-1.393 ; -1.53,-1.393 -1.53,-1.391 ; -1.53,-1.391 -1.53,-1.281 ; -1.53,-1.281 -1.53,-0.735 ; -1.53,-0.735 -1.53,-0.623 ; -1.52,-4.191 ccw(c-1.02,-4.191) -1.067,-4.689 ; -1.52,-4.191 -1.52,4.198 ; -1.52,-4.191 -1.472,-4.191 ; -1.52,4.198 cw(c-1.02,4.198) -1.067,4.696 ; -1.52,4.198 -1.472,4.198 ; -1.472,-4.191 ccw(c-1.022,-4.191) -1.064,-4.639 ; -1.472,-4.191 -1.472,4.198 ; -1.472,4.198 cw(c-1.022,4.198) -1.064,4.647 ; -1.067,-4.689 cw(c-0.688,-4.687) -1.064,-4.639 ; -1.067,4.696 ccw(c-0.688,4.694) -1.064,4.647 ; 1.657,-4.926 ccw(c1.677,-4.926) 1.677,-4.946 ; 1.657,-4.926 ccw(c1.676,-4.924) 1.677,-4.943 ; 1.657,-4.926 1.657,-3.436 ; 1.657,-3.436 ccw(c1.676,-3.434) 1.677,-3.452 ; 1.657,-3.436 1.657,3.443 ; 1.657,-3.436 1.677,-3.436 ; 1.657,3.443 cw(c1.676,3.441) 1.677,3.46 ; 1.657,3.443 1.657,4.934 ; 1.657,3.443 1.677,3.443 ; 1.657,4.934 cw(c1.677,4.934) 1.677,4.954 ; 1.657,4.934 cw(c1.676,4.932) 1.677,4.95 ; 1.677,-4.946 2.907,-4.946 ; 1.677,-4.946 1.677,-4.943 ; 1.677,-4.943 1.677,-3.452 ; 1.677,-4.943 2.907,-4.943 ; 1.677,-3.452 1.677,-3.436 ; 1.677,-3.452 2.907,-3.452 ; 1.677,-3.436 1.677,3.443 ; 1.677,-3.436 2.907,-3.436 ; 1.677,3.443 2.907,3.443 ; 1.677,3.443 1.677,3.46 ; 1.677,3.46 2.907,3.46 ; 1.677,3.46 1.677,4.95 ; 1.677,4.95 2.907,4.95 ; 1.677,4.95 1.677,4.954 ; 1.677,4.954 2.907,4.954 ; 2.907,-4.946 ccw(c2.907,-4.926) 2.927,-4.926 ; 2.907,-4.946 2.927,-4.946 2.927,-4.926 ; 2.907,-4.946 2.907,-4.943 ; 2.907,-4.943 ccw(c2.909,-4.924) 2.927,-4.926 ; 2.907,-4.943 2.907,-3.452 ; 2.907,-3.452 ccw(c2.909,-3.434) 2.927,-3.436 ; 2.907,-3.452 2.907,-3.436 ; 2.907,-3.436 2.907,3.443 ; 2.907,-3.436 2.927,-3.436 ; 2.907,3.443 2.907,3.46 ; 2.907,3.443 2.927,3.443 ; 2.907,3.46 cw(c2.909,3.441) 2.927,3.443 ; 2.907,3.46 2.907,4.95 ; 2.907,4.95 cw(c2.909,4.932) 2.927,4.934 ; 2.907,4.95 2.907,4.954 ; 2.907,4.954 cw(c2.907,4.934) 2.927,4.934 ; 2.907,4.954 2.927,4.954 2.927,4.934 ; 2.927,-4.926 2.927,-3.436 ; 2.927,-3.436 2.927,3.443 ; 2.927,3.443 2.927,4.934
  text ".Designator" at 0.7,-5.162 h3
3D body "User Library-Transistors TO-220F.step": height 24.87, standoff -4.5, extent -1.651,-5.07 3.049,5.07

## TO-247 ((HORIZONTAL, BOTTOM) [mm]
height 4.57
pads (4):
  rect 4x3 hole 1.8: 1(0,-5.56)
  oval 4x3 hole 1.8: 2(0,0) 3(0,5.56)
  round 0 hole 3.4 unplated: M(19.405,0)
Top Overlay:
  circle w0.6: c-3,-5.62 r0.3
  rectangle: 3.15,-8.1 4,8.1
  lines w0.2: 4,-8 4,8 25.55,8 25.55,-8 4,-8
Top Assy:
  circle w0.05: c19.405,0 r1.75
  circle w0.05: c19.405,0 r3.595
  lines w0.05: 4.5,-6.55 0.35,-6.55 0.35,-6.1 0.2,-6.1 ; 4.5,-4.35 0.35,-4.35 0.35,-4.8 0.2,-4.8 ; 4.5,-1.6 0.35,-1.6 0.35,-0.65 0.2,-0.65 ; 4.5,1.6 0.35,1.6 0.35,0.65 0.2,0.65 ; 4.5,4.35 0.35,4.35 0.35,4.8 0.2,4.8 ; 4.5,6.55 0.35,6.55 0.35,6.1 0.2,6.1 ; 0.2,-6.1 0.2,-4.8 ; 0.2,-6.1 -0.35,-6.1 -0.35,-4.8 0.2,-4.8 ; 0.2,-0.65 0.2,0.65 ; 0.2,-0.65 -0.35,-0.65 -0.35,0.65 0.2,0.65 ; 0.2,4.8 0.2,6.1 ; 0.2,4.8 -0.35,4.8 -0.35,6.1 0.2,6.1 ; 4.5,-8 17.25,-8 22.25,-8 25.55,-8 ; 4.5,-8 4.5,8 ; 4.5,-8 4.673,-7.827 ; 4.5,8 17.25,8 22.25,8 25.55,8 ; 4.5,8 4.673,7.827 ; 4.673,-7.827 25.377,-7.827 ; 4.673,-7.827 4.673,7.827 ; 4.673,7.827 25.377,7.827 ; 25.377,-7.827 25.55,-8 ; 25.377,-7.827 25.377,7.827 ; 25.377,7.827 25.55,8 ; 25.55,-8 25.55,8 ; 7.8,-6.7 16.2,-6.7 16.2,-7 23,-7 24.4,-5 24.4,-3 24,-3 24,3 24.4,3 24.4,5 23,7 16.2,7 16.2,6.7 7.8,6.7 7.8,-6.7
  text ".Designator" at 10.3,5.162 h3
3D body "User Library-TO-247 CASE 340L-02 Horizontal Bottom.STEP": height 5.2, standoff -4.8, extent -0.35,-8 25.55,8

## TO-247 ((HORIZONTAL, TOP) [mm]
height 4.57
pads (4):
  rect 4x3 hole 1.8: 1(0,5.56)
  oval 4x3 hole 1.8: 2(0,0) 3(0,-5.56)
  round 0 hole 3.4 unplated: M(19.405,0)
Top Overlay:
  circle w0.6: c-3,5.5 r0.3
  rectangle: 3.15,-8.1 4,8.1
  lines w0.2: 4,-8 4,8 25.55,8 25.55,-8 4,-8
Top Assy:
  circle w0.05: c19.405,0 r1.75
  lines w0.05: 0.2,-6.1 0.35,-6.1 0.35,-6.55 4.5,-6.55 ; 0.2,-6.1 -0.35,-6.1 -0.35,-4.8 0.2,-4.8 ; 0.2,-6.1 0.2,-4.8 ; 0.2,-4.8 0.35,-4.8 0.35,-4.35 4.5,-4.35 ; 0.2,-0.65 0.35,-0.65 0.35,-1.6 4.5,-1.6 ; 0.2,-0.65 -0.35,-0.65 -0.35,0.65 0.2,0.65 ; 0.2,-0.65 0.2,0.65 ; 0.2,0.65 0.35,0.65 0.35,1.6 4.5,1.6 ; 0.2,4.8 0.35,4.8 0.35,4.35 4.5,4.35 ; 0.2,4.8 -0.35,4.8 -0.35,6.1 0.2,6.1 ; 0.2,4.8 0.2,6.1 ; 0.2,6.1 0.35,6.1 0.35,6.55 4.5,6.55 ; 4.5,-8 17.25,-8 ; 4.5,-8 4.762,-7.738 ; 4.5,-8 4.5,-6.55 ; 4.5,-6.55 4.5,-4.35 ; 4.5,-4.35 4.5,-1.6 ; 4.5,-1.6 4.5,1.6 ; 4.5,1.6 4.5,4.35 ; 4.5,4.35 4.5,6.55 ; 4.5,6.55 4.5,8 ; 4.5,8 4.762,7.738 ; 4.5,8 17.25,8 ; 4.762,-7.738 17.198,-7.738 ; 4.762,-7.738 4.762,7.738 ; 4.762,7.738 17.198,7.738 ; 17.198,-7.738 17.198,-5.448 ; 17.198,-7.738 17.25,-8 ; 17.198,-5.448 22.302,-5.448 ; 17.198,-5.448 17.25,-5.5 ; 17.198,5.448 17.198,7.738 ; 17.198,5.448 22.302,5.448 ; 17.198,5.448 17.25,5.5 ; 17.198,7.738 17.25,8 ; 17.25,-8 17.25,-7.5 ; 17.25,-8 22.25,-8 ; 17.25,-7.5 22.25,-7.5 ; 17.25,-7.5 17.25,-5.5 ; 17.25,-5.5 22.25,-5.5 ; 17.25,5.5 17.25,7.5 ; 17.25,5.5 22.25,5.5 ; 17.25,7.5 17.25,8 ; 17.25,7.5 22.25,7.5 ; 17.25,8 22.25,8 ; 22.25,-8 25.55,-8 ; 22.25,-8 22.302,-7.738 ; 22.25,-8 22.25,-7.5 ; 22.25,-7.5 22.25,-5.5 ; 22.25,-5.5 22.302,-5.448 ; 22.25,5.5 22.302,5.448 ; 22.25,5.5 22.25,7.5 ; 22.25,7.5 22.25,8 ; 22.25,8 22.302,7.738 ; 22.25,8 25.55,8 ; 22.302,-7.738 24.746,-7.738 ; 22.302,-7.738 22.302,-5.448 ; 22.302,5.448 22.302,7.738 ; 22.302,7.738 24.746,7.738 ; 24.746,-7.738 25.55,-8 ; 24.746,-7.738 24.746,7.738 ; 24.746,7.738 25.55,8 ; 25.55,-8 25.55,8
  text ".Designator" at 10.3,5.162 h3
3D body "TO-247 CASE 340L-02 Horizontal Top.STEP": height 5.2, standoff -4.78, extent -0.35,-8 25.55,8

## TO-247 (VERTICAL) [mm]
height 4.57
pads (3):
  rect 4x3 hole 1.8: 1(0,5.56)
  oval 4x3 hole 1.8: 2(0,0) 3(0,-5.56)
Top Overlay:
  circle w0.6: c-3,5.5 r0.3
  rectangle: 2.8,-8.1 3.65,8.1
  lines w0.2: -2.2,-8 2.8,-8 2.8,8 -2.2,8
Top Assy:
  lines w0.05: 2.78,-7 2.8,-7 2.8,-5 ; 2.78,-5 2.8,-5 ; 2.78,-3 2.8,-3 ; 2.78,3 2.8,3 ; 2.78,5 2.8,5 ; 2.78,7 2.8,7 2.8,5 ; 0.8,-8 -2.2,-7.738 -2.2,7.738 0.8,8 ; 0.8,-8 0.8,8 ; 0.8,-8 2.78,-7.827 2.78,7.827 0.8,8 ; 2.8,-5 2.8,-3 ; 2.8,-3 2.8,3 ; 2.8,3 2.8,5
  text ".Designator" at -4.2,5.162 h3
3D body "TO-247 CASE 340L-02 Vertical.STEP": height 30.55, standoff -3.5, extent -2.2,-8 2.8,8

## TO-247_with_dual_TO-220 [mm]
height 4.57
pads (6):
  rect 3.2x1.8 hole 1.2: 1(0,2.8) 2(0,10.96)
  rect 4x2.4 hole 1.8: 1(0,5.56)
  oval 4x2.4 hole 1.8: 2(0,0) 3(0,-5.56)
  oval 3.2x1.8 hole 1.2: 3(0,-2.8)
Top Overlay:
  circle w0.6: c-3.75,6.5 r0.3
  circle w0.5: c-4,0 r0.25
  rectangle: 2.4,3.3 2.9,13.3
  rectangle: 2.4,-7.85 2.9,2.15
  region: 5.25,-2.95 5.25,-2.45 3.25,-2.45 3.25,-2.95
  region: 5.25,9.57 5.25,10.07 3.25,10.07 3.25,9.57
  region: -3,-2.5 -3,-2 -5,-2 -5,-2.5
  region: -5,2.5 -5,2 -3,2 -3,2.5
  region: 5.25,-4.45 3.25,-4.45 4.25,-2.95
  region: 5.25,8.07 3.25,8.07 4.25,9.57
  region: -5,-4 -3,-4 -4,-2.5
  region: -5,4 -3,4 -4,2.5
  lines w0.2: -4,0 -3,0 ; -3,-5.5 -4,-5.5 -4,5.5 -3,5.5 ; -1.25,-8 -2.45,-8 -2.45,8 -1.25,8
  lines w0.254: 3.25,-6.45 4.25,-6.45 4.25,-0.7 3.25,-0.7 ; 3.25,6.07 4.25,6.07 4.25,11.82 3.25,11.82
  text "TO-220" at 3.25,5.582 h1
  text "2x" at 5,3.583 h1
  text "TO-247" at -4.25,13.082 h1
Top Assy:
  drawing of 242 lines, arcs and shapes, not listed
  text ".Designator" at 0.7,-7.962 h3
  text ".Designator" at -4.2,5.162 h3
  text ".Designator" at 0.7,3.158 h3
3D body "TO220-2.STEP": height 20.05, standoff -3.5, extent -1.55,-7.75 2.907,2.15
3D body "TO220-2.STEP": height 20.05, standoff -3.5, extent -1.55,3.37 2.907,13.27

## TO-247_with_TO-220 (VERTICAL) [mm]
height 4.57
pads (5):
  rect 3.2x1.8 hole 1.2: 1(0,2.8)
  rect 4x2.4 hole 1.8: 1(0,5.56)
  oval 4x2.4 hole 1.8: 2(0,0) 3(0,-5.56)
  oval 3.2x1.8 hole 1.2: 3(0,-2.8)
Top Overlay:
  circle w0.6: c-3,5.5 r0.3
  rectangle: 2.8,-8.1 3.65,8.1
  rectangle: 2.5,-5 3.4,5
  lines w0.2: -2.2,-8 2.8,-8 2.8,8 -2.2,8
Top Assy:
  lines w0.05: 2.78,-7 2.8,-7 2.8,-5 ; 2.78,-5 2.8,-5 ; 2.78,-3 2.8,-3 ; 2.78,3 2.8,3 ; 2.78,5 2.8,5 ; 2.78,7 2.8,7 2.8,5 ; 0.8,-8 -2.2,-7.738 -2.2,7.738 0.8,8 ; 0.8,-8 0.8,8 ; 0.8,-8 2.78,-7.827 2.78,7.827 0.8,8 ; 2.8,-5 2.8,-3 ; 2.8,-3 2.8,3 ; 2.8,3 2.8,5
  text ".Designator" at -4.2,5.162 h3
3D body "TO-247 CASE 340L-02 Vertical.STEP": height 30.55, standoff -3.5, extent -2.2,-8 2.8,8

## TO-247_with_TO-220 (VERTICAL)SLOT [mm]
height 4.57
pads (3):
  rect 3.5x4.8 hole 4 slot 1.5 at 0 deg: 1(0,4.3)
  oval 4x2.4 hole 1.8: 2(0,0)
  oval 3.5x4.8 hole 4 slot 1.5 at 0 deg: 3(0,-4.3)
Top Overlay:
  circle w0.6: c-3,5.5 r0.3
  rectangle: 2.8,-8.1 3.65,8.1
  rectangle: 2.5,-5 3.4,5
  lines w0.2: -2.2,-8 2.8,-8 2.8,8 -2.2,8
Top Assy:
  lines w0.05: 2.78,-7 2.8,-7 2.8,-5 ; 2.78,-5 2.8,-5 ; 2.78,-3 2.8,-3 ; 2.78,3 2.8,3 ; 2.78,5 2.8,5 ; 2.78,7 2.8,7 2.8,5 ; 0.8,-8 -2.2,-7.738 -2.2,7.738 0.8,8 ; 0.8,-8 0.8,8 ; 0.8,-8 2.78,-7.827 2.78,7.827 0.8,8 ; 2.8,-5 2.8,-3 ; 2.8,-3 2.8,3 ; 2.8,3 2.8,5
  text ".Designator" at -4.2,5.162 h3
3D body "TO-247 CASE 340L-02 Vertical.STEP": height 30.55, standoff -3.5, extent -2.2,-8 2.8,8

## TO-252-3 [mm] "D-PAK, 3-Pads, Body 6.15x6.66mm (max), IPC Medium Density"
height 2.38
pads (3):
  rect 2.7x1 smd paste+0 mask+0.05: 1(-4.2,2.28) 3(-4.2,-2.28)
  rect 6.3x6.6 smd paste-50 mask+0.05: 2(2.45,0)
Top Overlay:
  circle w0.25: c-4.2,3.33 r0.125
  lines w0.2: -1.1,-3.3 -1.85,-3.3 -1.85,3.3 -1.1,3.3
Top Paste:
  region: -0.05,2.5 -0.05,3.1 -0.65,3.1 -0.65,2.5
  region: -0.05,1.7 -0.05,2.3 -0.65,2.3 -0.65,1.7
  region: 0.75,2.5 0.75,3.1 0.15,3.1 0.15,2.5
  region: 0.75,1.7 0.75,2.3 0.15,2.3 0.15,1.7
  region: 1.55,2.5 1.55,3.1 0.95,3.1 0.95,2.5
  region: 1.55,1.7 1.55,2.3 0.95,2.3 0.95,1.7
  region: 2.35,2.5 2.35,3.1 1.75,3.1 1.75,2.5
  region: 2.35,1.7 2.35,2.3 1.75,2.3 1.75,1.7
  region: 3.15,2.5 3.15,3.1 2.55,3.1 2.55,2.5
  region: 3.15,1.7 3.15,2.3 2.55,2.3 2.55,1.7
  region: 3.95,2.5 3.95,3.1 3.35,3.1 3.35,2.5
  region: 3.95,1.7 3.95,2.3 3.35,2.3 3.35,1.7
  region: 4.75,2.5 4.75,3.1 4.15,3.1 4.15,2.5
  region: 4.75,1.7 4.75,2.3 4.15,2.3 4.15,1.7
  region: 5.55,2.5 5.55,3.1 4.95,3.1 4.95,2.5
  region: 5.55,1.7 5.55,2.3 4.95,2.3 4.95,1.7
  region: -0.05,0.9 -0.05,1.5 -0.65,1.5 -0.65,0.9
  region: 0.75,0.9 0.75,1.5 0.15,1.5 0.15,0.9
  region: 1.55,0.9 1.55,1.5 0.95,1.5 0.95,0.9
  region: 2.35,0.9 2.35,1.5 1.75,1.5 1.75,0.9
  region: 3.15,0.9 3.15,1.5 2.55,1.5 2.55,0.9
  region: 3.95,0.9 3.95,1.5 3.35,1.5 3.35,0.9
  region: 4.75,0.9 4.75,1.5 4.15,1.5 4.15,0.9
  region: 5.55,0.9 5.55,1.5 4.95,1.5 4.95,0.9
  region: -0.05,0.1 -0.05,0.7 -0.65,0.7 -0.65,0.1
  region: 0.75,0.1 0.75,0.7 0.15,0.7 0.15,0.1
  region: 1.55,0.1 1.55,0.7 0.95,0.7 0.95,0.1
  region: 2.35,0.1 2.35,0.7 1.75,0.7 1.75,0.1
  region: 3.15,0.1 3.15,0.7 2.55,0.7 2.55,0.1
  region: 3.95,0.1 3.95,0.7 3.35,0.7 3.35,0.1
  region: 4.75,0.1 4.75,0.7 4.15,0.7 4.15,0.1
  region: 5.55,0.1 5.55,0.7 4.95,0.7 4.95,0.1
  region: -0.05,-0.7 -0.05,-0.1 -0.65,-0.1 -0.65,-0.7
  region: 0.75,-0.7 0.75,-0.1 0.15,-0.1 0.15,-0.7
  region: 1.55,-0.7 1.55,-0.1 0.95,-0.1 0.95,-0.7
  region: 2.35,-0.7 2.35,-0.1 1.75,-0.1 1.75,-0.7
  region: 3.15,-0.7 3.15,-0.1 2.55,-0.1 2.55,-0.7
  region: 3.95,-0.7 3.95,-0.1 3.35,-0.1 3.35,-0.7
  region: 4.75,-0.7 4.75,-0.1 4.15,-0.1 4.15,-0.7
  region: 5.55,-0.7 5.55,-0.1 4.95,-0.1 4.95,-0.7
  region: -0.05,-1.5 -0.05,-0.9 -0.65,-0.9 -0.65,-1.5
  region: 0.75,-1.5 0.75,-0.9 0.15,-0.9 0.15,-1.5
  region: 1.55,-1.5 1.55,-0.9 0.95,-0.9 0.95,-1.5
  region: 2.35,-1.5 2.35,-0.9 1.75,-0.9 1.75,-1.5
  region: 3.15,-1.5 3.15,-0.9 2.55,-0.9 2.55,-1.5
  region: 3.95,-1.5 3.95,-0.9 3.35,-0.9 3.35,-1.5
  region: 4.75,-1.5 4.75,-0.9 4.15,-0.9 4.15,-1.5
  region: 5.55,-1.5 5.55,-0.9 4.95,-0.9 4.95,-1.5
  region: -0.05,-2.3 -0.05,-1.7 -0.65,-1.7 -0.65,-2.3
  region: 0.75,-2.3 0.75,-1.7 0.15,-1.7 0.15,-2.3
  region: 1.55,-2.3 1.55,-1.7 0.95,-1.7 0.95,-2.3
  region: 2.35,-2.3 2.35,-1.7 1.75,-1.7 1.75,-2.3
  region: 3.15,-2.3 3.15,-1.7 2.55,-1.7 2.55,-2.3
  region: 3.95,-2.3 3.95,-1.7 3.35,-1.7 3.35,-2.3
  region: 4.75,-2.3 4.75,-1.7 4.15,-1.7 4.15,-2.3
  region: 5.55,-2.3 5.55,-1.7 4.95,-1.7 4.95,-2.3
  region: -0.05,-3.1 -0.05,-2.5 -0.65,-2.5 -0.65,-3.1
  region: 0.75,-3.1 0.75,-2.5 0.15,-2.5 0.15,-3.1
  region: 1.55,-3.1 1.55,-2.5 0.95,-2.5 0.95,-3.1
  region: 2.35,-3.1 2.35,-2.5 1.75,-2.5 1.75,-3.1
  region: 3.15,-3.1 3.15,-2.5 2.55,-2.5 2.55,-3.1
  region: 3.95,-3.1 3.95,-2.5 3.35,-2.5 3.35,-3.1
  region: 4.75,-3.1 4.75,-2.5 4.15,-2.5 4.15,-3.1
  region: 5.55,-3.1 5.55,-2.5 4.95,-2.5 4.95,-3.1
Top Assy:
  drawing of 534 lines, arcs and shapes, not listed
  text ".Designator" at -5.162,-0.7 h3
Top Text:
  lines w0.05: -5.8,-3.55 -5.8,3.55 5.8,3.55 5.8,-3.55 -5.8,-3.55
  lines w0.1: -0.5,0 0.5,0 ; 0,-0.5 0,0.5
3D body "CircuitWorks-TO-252.step": height 2.3, standoff 0, extent -4.823,-3.29 4.877,3.29